# Altium footprint library LDCN Components.PcbLib: 426 footprints (part 2 of 27)
Each footprint in its own frame and in the unit in brackets; x right, y up, seen from the top. Pads: shape width x height; smd on the part's side, far side on the other; paste and mask are expansions set on the pad; w line width, h text height; cw(c..) or ccw(c..) is an arc to the next point about the centre after c.
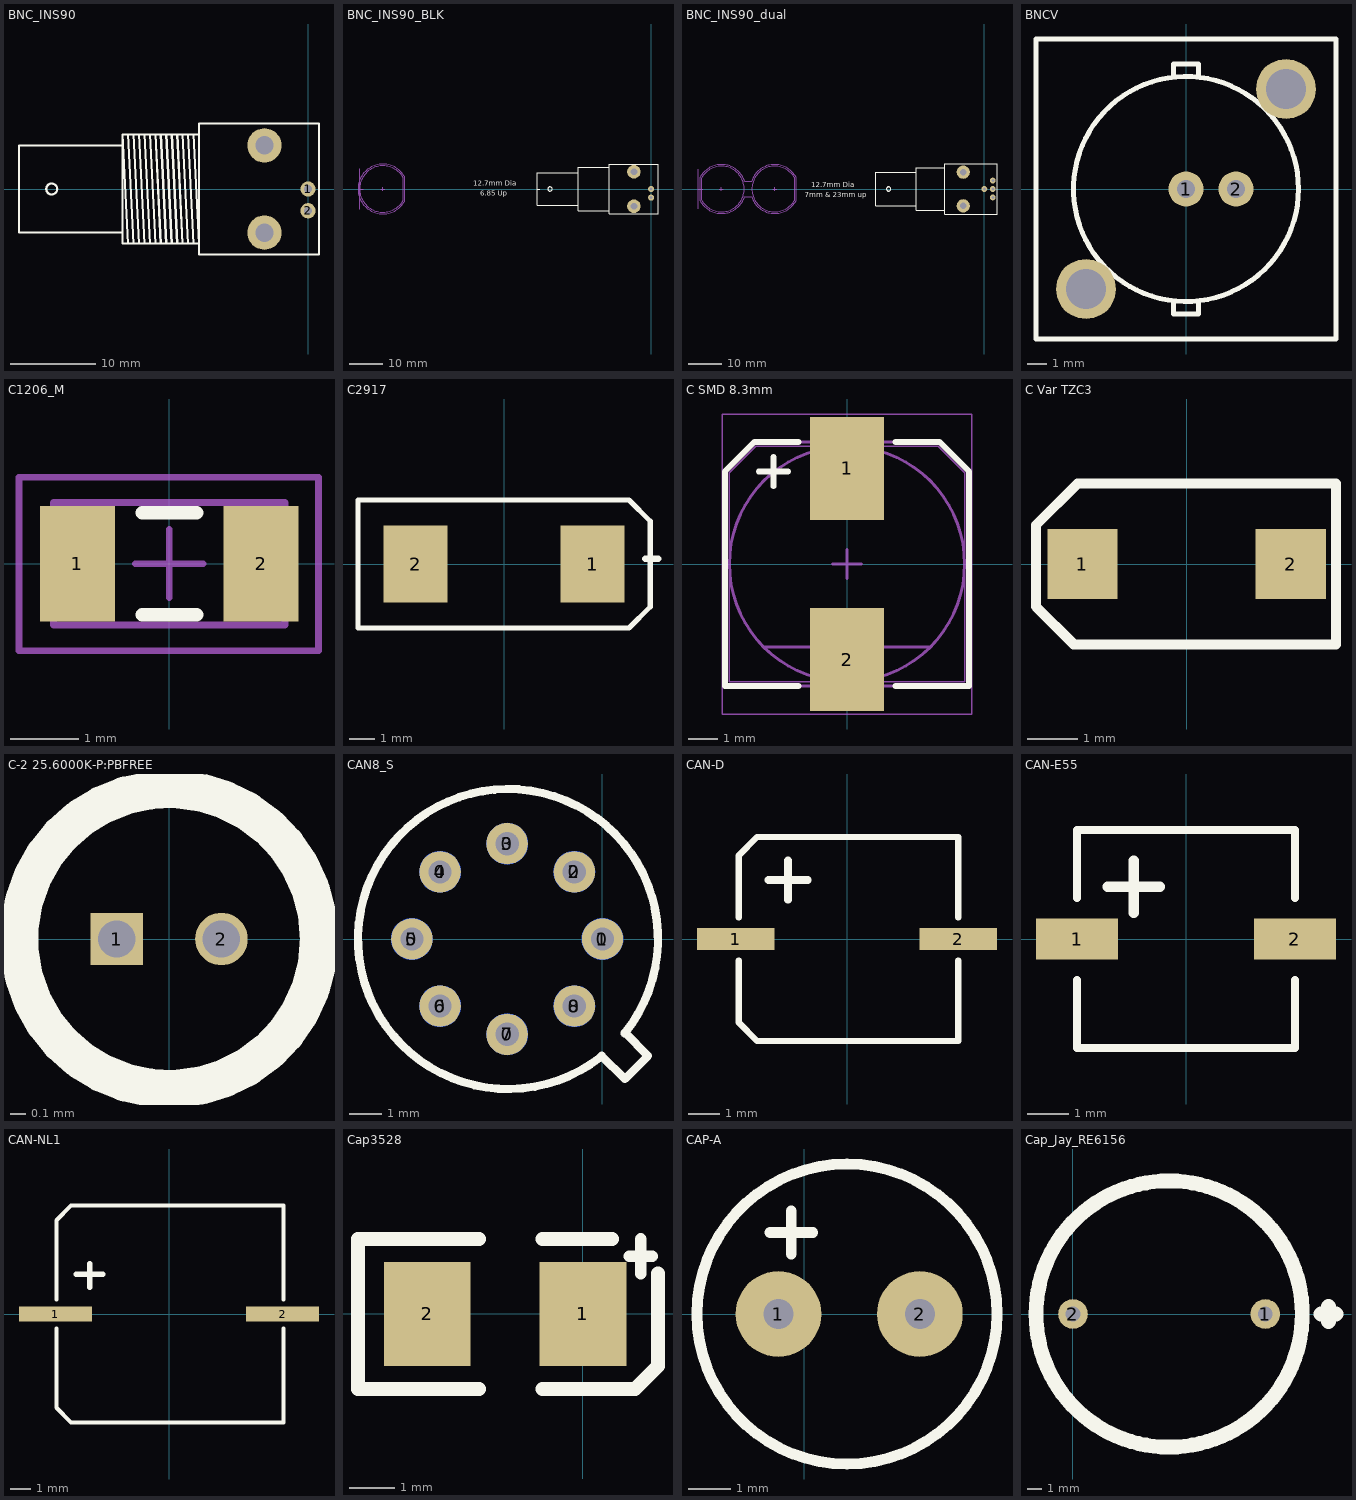
[diagram p1: the footprints below, top view; thin cyan lines are the x and y axes]

## BNC_INS90 [mil] "BNC INSULATED 90 Degrees"
height 500
pads (4):
  round 70 hole 36: 1(0,0) 2(0,-100)
  round 157.48 hole 84: ""(-200,-200) ""(-200,200)
Top Overlay:
  circle w10: c-1175,0 r25
  lines w10: -850,-200 -1325,-200 -1325,200 -850,200 ; -825,-250 -850,250 ; -825,250 -800,-250 ; -800,250 -775,-250 ; -775,250 -750,-250 ; -750,250 -725,-250 ; -725,250 -700,-250 ; -700,250 -675,-250 ; -675,250 -650,-250 ; -650,250 -625,-250 ; -625,250 -600,-250 ; -600,250 -575,-250 ; -575,250 -550,-250 ; -550,250 -525,-250 ; -500,250 -525,250 ; -850,250 -850,-250 -500,-250 -525,250 ; -850,250 -525,250 ; -500,-300 -500,-275 -500,300 50,300 50,-300 -500,-300

## BNC_INS90_BLK [mm] "BNC TE 1-1634613-0"
height 13.16
pads (4):
  round 1.778 hole 0.914: 1(0,0) 2(0,-2.54)
  round 4 hole 2: ""(-5.08,-5.08) ""(-5.08,5.08)
Top Overlay:
  circle w0.254: c-29.845,0 r0.635
  lines w0.254: -33.58,0 -32.9,0 ; -21.59,-4.8 -33.58,-4.8 -33.58,4.8 -21.59,4.8 ; -12.38,-6.35 -21.58,-6.35 -21.58,6.35 -12.38,6.35 ; -12.38,-7.35 -12.38,7.35 2.02,7.35 2.02,-7.35 -12.38,-7.35
  text "6.85 Up" at -50.5,-2 h1.52
  text "12.7mm Dia" at -52.5,1 h1.52
Mechanical 21:
  lines w0.254: -73.158,-3.319 cw(c-79.15,0) -73.158,3.319 -73.158,1.267 -73.158,0.742 -73.158,-3.319
Mechanical 22:
  lines w0.254: -86,-6 -86,6 ; -86,0 -85,0 ; -79.75,0 -78.55,0 ; -79.15,-0.5 -79.15,0.5
Mechanical 25:
  lines w0.254: -72.72,-3.561 cw(c-79.15,0) -72.72,3.561 -72.72,-3.561

## BNC_INS90_dual [mm] "Dual BNC Amphenol 031-6575"
height 29
pads (6):
  round 1.778 hole 0.9: 1(0,0) 2(2.54,2.54) 3(2.54,0) 4(2.54,-2.54)
  round 4 hole 2: ""(-6.35,-5.08) ""(-6.35,5.08)
Top Overlay:
  circle w0.254: c-28.778,0 r0.635
  lines w0.254: -20.523,-5.08 -32.588,-5.08 -32.588,5.08 -20.523,5.08 ; -11.913,-6.35 -20.513,-6.35 -20.513,6.35 -11.913,6.35 ; -11.913,-7.62 3.81,-7.62 3.81,7.62 -11.913,7.62 -11.913,-7.62
  text "12.7mm Dia" at -52,0.5 h1.52
  text "7mm & 23mm up" at -54,-2.5 h1.52
Mechanical 21:
  lines w0.254: -84.992,-3.319 ccw(c-79,0) -84.992,3.319 -84.992,-3.319 ; -57.008,-3.319 cw(c-63,0) -57.008,3.319 -57.008,-3.319
Mechanical 22:
  lines w0.254: -86,-6 -86,6 ; -86,0 -84.6,0 ; -79.6,0 -78.4,0 ; -79,-0.5 -79,0.5 ; -63.6,0 -62.4,0 ; -63,-0.5 -63,0.5
Mechanical 25:
  lines w0.254: -72.058,-2.4 -69.947,-2.4 ; -72.053,-2.402 cw(c-79,0) -85.43,-3.561 -85.43,3.561 cw(c-79,0) -72.053,2.402 ; -72.053,2.4 -69.947,2.4 ; -69.947,-2.402 ccw(c-63,0) -56.57,-3.561 -56.57,3.561 ccw(c-63,0) -69.947,2.402

## BNCV [mil]
pads (4):
  round 70 hole 36: 1(0,0) 2(100,0)
  round 120 hole 80: ""(-200,-200) ""(200,200)
Top Overlay:
  circle w10: c0,0 r225
  lines w10: -25,-225 -25,-250 25,-250 25,-225 ; -25,225 -25,250 25,250 25,225 ; -300,-300 -300,300 300,300 300,-300 -300,-300

## C1206_M [mm] "Chip Capacitor, Body 3.2x1.6mm"
height 1.3
pads (2):
  rect 1.1x1.7 smd: 1(-1.35,0) 2(1.35,0)
Top Overlay:
  lines w0.2: -0.4,-0.75 0.4,-0.75 ; -0.4,0.75 0.4,0.75
Mechanical 13:
  lines w0.1: -1.7,-0.9 1.7,-0.9 1.7,0.9 -1.7,0.9 -1.7,-0.9
Mechanical 15:
  lines w0.1: -0.5,0 0.5,0 ; 0,-0.5 0,0.5 ; -2.209,-1.28 -2.209,1.27 2.191,1.27 2.191,-1.28 -2.209,-1.28
3D body: height 1.3, standoff 0, extent -1.7,-0.9 1.7,0.9

## C2917 [mm]
pads (2):
  rect 2.5x3 smd: 1(3.45,0) 2(-3.45,0)
Top Overlay:
  lines w0.2: -5.7,-2.5 4.867,-2.5 5.7,-1.667 5.7,1.667 4.867,2.5 -5.7,2.5 -5.7,0 -5.7,-2.5
  lines w0.254: 5.5,0.2 6,0.2

## C SMD 8.3mm [mm] "Electrolytic 8.3x8.3mm"
pads (2):
  rect 2.5x3.5 smd: 1(0,3.25) 2(0,-3.25)
Top Overlay:
  lines w0.2: -3,3.143 -2,3.143 ; -2.5,2.643 -2.5,3.643 ; -1.65,-4.15 -4.15,-4.15 -4.15,3.15 -3.15,4.15 -1.65,4.15 ; 1.65,-4.15 4.15,-4.15 4.15,3.15 3.15,4.15 1.65,4.15
Mechanical 13:
  lines w0.05: -4,-4 -4,3.1 -3.1,4 3.1,4 4,3.1 4,-4 -4,-4 ; -0.5,-4.45 0.5,-4.45 0.5,-2.05 ccw(c0,-2.05) -0.5,-2.05 -0.5,-4.45
  lines w0.1: -2.828,-2.828 cw(c0,0) 2.828,-2.828 ; -2.828,-2.828 ccw(c0,0) 2.828,-2.828 ; -2.828,-2.828 2.828,-2.828 ; -4.15,-4.15 4.15,-4.15 4.15,3.15 3.15,4.15 -3.15,4.15 -4.15,3.15 -4.15,-4.15
Mechanical 15:
  lines w0.05: -4.25,-5.1 -4.25,5.1 4.25,5.1 4.25,-5.1 -4.25,-5.1
  lines w0.1: -0.5,0 0.5,0 ; 0,-0.5 0,0.5
3D body: height 0.3, standoff 0, extent -0.501,1.549 0.5,4.45
3D body: height 0.3, standoff 0, extent -0.5,-4.45 0.501,-1.549
3D body: height 0.5, standoff 0.3, extent -4.151,-4.151 4.151,4.151
3D body: height 1.5, standoff 0.3, extent -4.15,-4.15 4.15,4.15
3D body: height 11, standoff 0.5, extent -2.829,-4.001 2.829,-2.828
3D body: height 11, standoff 0.5, extent -4.01,-2.829 4.001,4.007

## C Var TZC3 [mm] "Murata TZC3 Series"
height 1.6
pads (2):
  rect 1.4x1.4 smd: 1(-2.075,0) 2(2.075,0)
Top Overlay:
  lines w0.2: -3,-0.85 -2.25,-1.6 2.975,-1.6 2.975,1.6 -2.175,1.6 -3,0.775 -3,-0.85

## C-2 25.6000K-P:PBFREE [mm] "CRYSTAL 25.6000KHZ 11PF TH"
height 6
pads (2):
  rect 0.35x0.35 hole 0.25: 1(-0.35,0)
  round 0.35 hole 0.25: 2(0.35,0)
Top Overlay:
  circle w0.254: c0,0 r1

## CAN8_S [mil]
pads (16):
  round 50 smd: 0(-230,0) 0(-196,-81) 0(-196,81) 0(-115,-115) 0(-115,115) 0(-34,-81) 0(-34,81) 0(0,0)
  round 50 on Bottom hole 28: 1(0,0) 2(-34,81) 3(-115,115) 4(-196,81) 5(-230,0) 6(-196,-81) 7(-115,-115) 8(-34,-81)
Top Overlay:
  lines w10: -2.57,-142.63 cw(c-114,0) 26.66,-113.91 ; -1,-141 27,-169 55,-141 27,-113

## CAN-D [mm]
pads (2):
  rect 2.5x0.7 smd: 1(-3.6,0) 2(3.6,0)
Top Overlay:
  lines w0.2: -3.5,-0.7 -3.5,-2.7 -2.9,-3.3 3.6,-3.3 3.6,-0.7 ; -3.5,0.7 -3.5,2.7 -2.9,3.3 3.6,3.3 3.6,0.7
  lines w0.254: -2.54,1.905 -1.27,1.905 ; -1.905,1.27 -1.905,2.54

## CAN-E55 [mm]
pads (2):
  rect 2x1 smd: 1(-2.65,0) 2(2.65,0)
Top Overlay:
  lines w0.2: -2.65,-1 -2.65,-2.65 2.65,-2.65 2.65,-1 ; -2.65,1 -2.65,2.65 2.65,2.65 2.65,1
  lines w0.254: -1.905,1.27 -0.635,1.27 ; -1.27,0.635 -1.27,1.905

## CAN-NL1 [mm]
pads (2):
  rect 3.5x0.7 smd: 1(-5.45,0) 2(5.45,0)
Top Overlay:
  lines w0.2: -5.4,-0.7 -5.4,-4.5 -4.7,-5.2 5.5,-5.2 5.5,-0.7 ; -5.4,0.7 -5.4,4.5 -4.7,5.2 5.5,5.2 5.5,0.7
  lines w0.254: -4.445,1.905 -3.175,1.905 ; -3.81,1.27 -3.81,2.405

## Cap3528 [mil]
height 118.11
pads (2):
  rect 75x90 smd: 1(0,0) 2(-135,0)
Top Overlay:
  lines w10: 40,50 60,50 ; 50,35 50,65
  lines w12: -90,-65 -195,-65 -195,65 -90,65 ; -35,-65 45,-65 65,-45 65,35 ; -35,65 25,65

## CAP-A [mm]
pads (2):
  round 2 hole 0.7: 1(-0.6,0) 2(2.7,0)
Top Overlay:
  circle w0.254: c1,0 r3.5
  lines w0.254: -0.8,1.9 0.2,1.9 ; -0.3,1.4 -0.3,2.4

## Cap_Jay_RE6156 [mm]
pads (2):
  round 2 hole 1: 1(13,0) 2(0,0)
Top Overlay:
  circle w1: c6.5,0 r9
  lines w1: 16.764,0 17.78,0 ; 17.272,-0.508 17.272,0.508